# Altium footprint library LDCN Components.PcbLib: 426 footprints (part 27 of 27)
Each footprint in its own frame and in the unit in brackets; x right, y up, seen from the top. Pads: shape width x height; smd on the part's side, far side on the other; paste and mask are expansions set on the pad; w line width, h text height; cw(c..) or ccw(c..) is an arc to the next point about the centre after c.
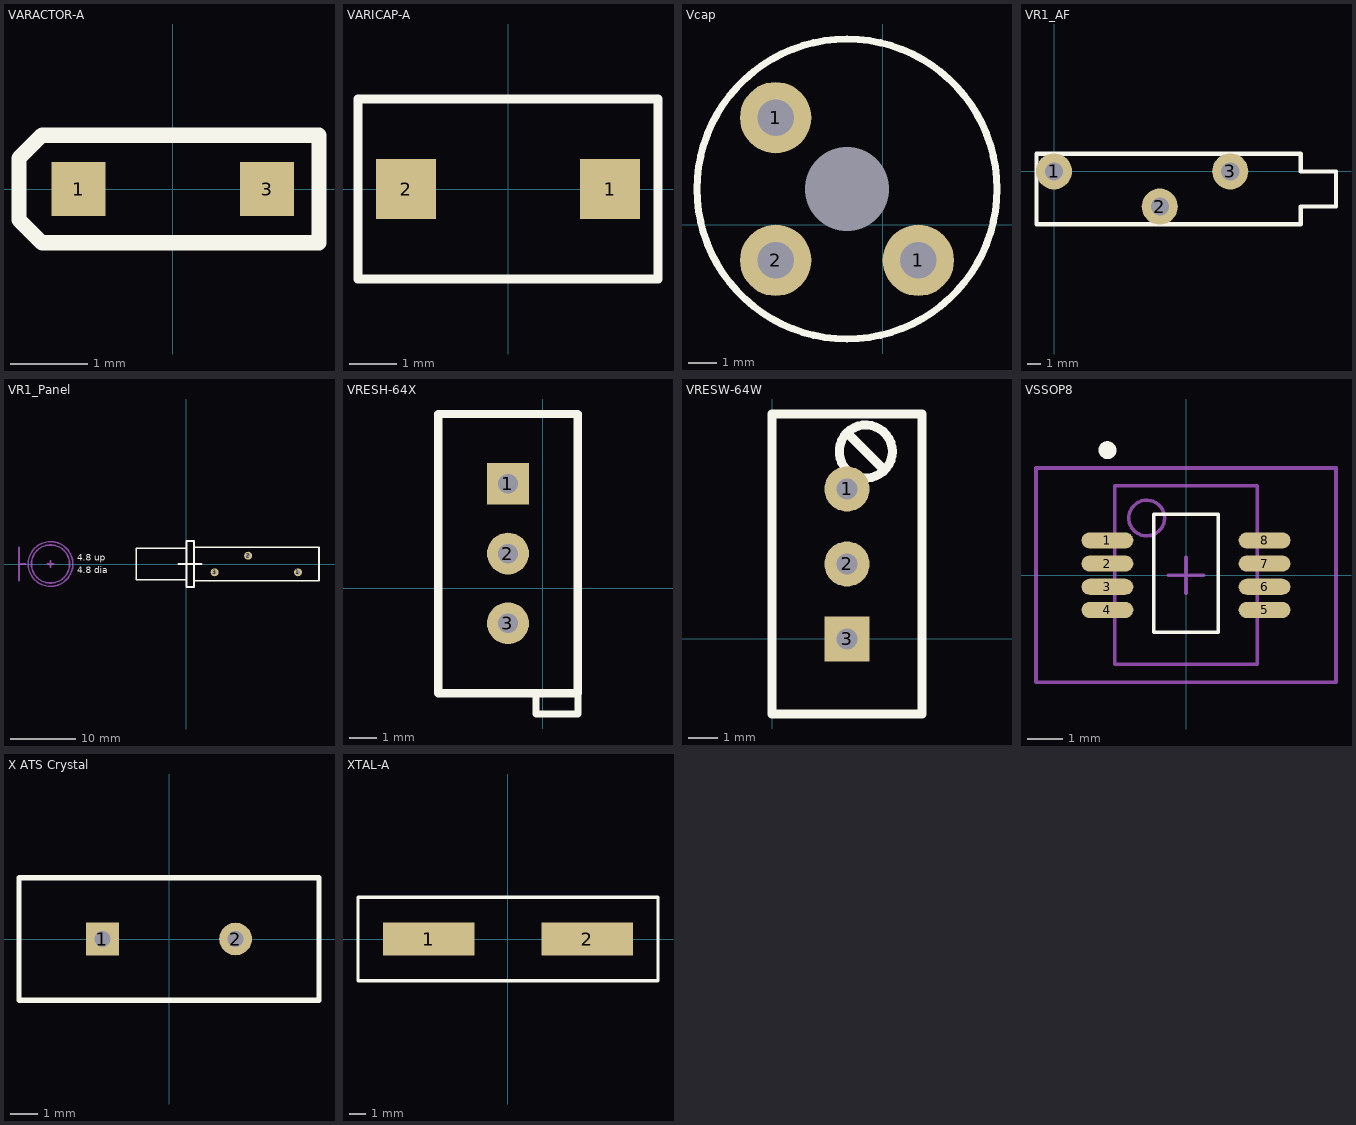
[diagram p26: the footprints below, top view; thin cyan lines are the x and y axes]

## VARACTOR-A [mm]
pads (2):
  rect 0.7x0.7 smd: 1(-1.225,0) 3(1.225,0)
Top Overlay:
  lines w0.2: -2,-0.4 -2,0.4 -1.7,0.7 1.9,0.7 1.9,-0.7 -1.7,-0.7 -2,-0.4

## VARICAP-A [mil]
pads (2):
  rect 50x50 smd: 1(85,0) 2(-85,0)
Top Overlay:
  lines w7.87: -125,-75 125,-75 125,75 -125,75 -125,-75

## Vcap [mm] "Variable Capacitor - Vertical"
height 8
pads (4):
  rect 0x0 hole 3: 0(-1.27,1.27)
  round 2.54 hole 1.3: 1(-3.81,3.81) 1(1.27,-1.27) 2(-3.81,-1.27)
Top Overlay:
  circle w0.254: c-1.27,1.27 r5.34

## VR1_AF [mm]
height 5
pads (3):
  round 2.6 hole 1.3: 1(0,0) 2(7.62,-2.54) 3(12.7,0)
Top Overlay:
  lines w0.305: -1.27,-3.81 17.78,-3.81 17.78,-2.54 20.32,-2.54 20.32,0 17.78,0 17.78,1.27 -1.27,1.27 -1.27,-3.81

## VR1_Panel [mm]
height 5
pads (3):
  round 1.2 hole 0.6: 1(16.993,-1.27) 2(9.393,1.27) 3(4.293,-1.27)
Top Overlay:
  lines w0.254: -1.2,0 2.323,0 ; 0,-2.413 0,0 ; 0,1.177 0,2.413 ; 0.003,-2.4 -7.617,-2.4 -7.617,2.4 0.003,2.4 ; 1.143,-2.54 20.193,-2.54 20.193,2.54 1.143,2.54 ; 1.143,-2.54 1.143,2.54 ; 1.143,-2.54 1.143,-3.5 0.003,-3.5 0.003,3.5 1.143,3.5 1.143,2.54
  text "4.8 up" at -16.6,0.5 h1.02
  text "4.8 dia" at -16.6,-1.4 h1.02
Mechanical 21:
  circle w0.254: c-20.7,0 r2.9
Mechanical 22:
  lines w0.254: -25.5,-2.54 -25.5,0 ; -25.5,2.54 -25.5,0 ; -21.2,0 -20.2,0 ; -20.7,-0.5 -20.7,0.5 ; -25.5,0 -24.5,0 -25.5,0
Mechanical 25:
  circle w0.254: c-20.7,0 r3.4

## VRESH-64X [mil] "Vishay Spectrol 64X Series"
height 314.96
pads (3):
  rect 60x60 hole 28: 1(-50,150)
  round 60 hole 28: 2(-50,50) 3(-50,-50)
Top Overlay:
  lines w10: -10,-150 -10,-180 50,-180 50,-150
  lines w12: -150,-150 -150,250 50,250 50,-150 -150,-150

## VRESW-64W [mil] "Vishay Spectrol 64W Series"
pads (3):
  round 60 hole 28: 1(100,200) 2(100,100)
  rect 60x60 hole 28: 3(100,0)
Top Overlay:
  circle w12: c125,250 r35.35
  lines w12: 100,275 150,225 ; 0,-100 0,300 200,300 200,-100 0,-100

## VSSOP8 [mm] "VSSOP8, 8-Leads, Small Outline, Body 3.1x3.1mm, Pitch 0.65mm"
height 1.1
pads (8):
  oval 1.45x0.45 smd: 1(-2.2,0.975) 2(-2.2,0.325) 3(-2.2,-0.325) 4(-2.2,-0.975) 5(2.2,-0.975) 6(2.2,-0.325) 7(2.2,0.325) 8(2.2,0.975)
Top Overlay:
  circle w0.25: c-2.2,3.5 r0.125
  lines w0.1: -0.9,-1.6 0.9,-1.6 0.9,1.7 -0.9,1.7 -0.9,-1.6
Mechanical 13:
  circle w0.1: c-1.1,1.6 r0.5
  lines w0.1: -2,-2.5 2,-2.5 2,2.5 -2,2.5 -2,-2.5
Mechanical 15:
  lines w0.1: -0.5,0 0.5,0 ; 0,-0.5 0,0.5 ; -4.2,-3 4.2,-3 4.2,3 -4.2,3 -4.2,-3
3D body: height 1.75, standoff 0, extent -2,-2.5 2,2.5
3D body "SOIC08 narrow.stp": height 2, standoff 0, extent -3.157,-2.481 3.006,2.519

## X ATS Crystal [mm]
pads (2):
  rect 1.2x1.2 hole 0.6: 1(-2.44,0)
  round 1.2 hole 0.6: 2(2.44,0)
Top Overlay:
  lines w0.2: -5.5,-2.25 -5.5,2.25 5.5,2.25 5.5,-2.25 -5.5,-2.25

## XTAL-A [mm]
pads (2):
  rect 5.5x2 smd: 1(-4.75,0) 2(4.75,0)
Top Overlay:
  lines w0.2: -9,-2.5 -9,0 -9,2.5 9,2.5 9,-2.5 -9,-2.5